# Altium footprint library 430 integreted.PcbLib: 281 footprints (part 4 of 18)
Each footprint in its own frame and in the unit in brackets; x right, y up, seen from the top. Pads: shape width x height; smd on the part's side, far side on the other; paste and mask are expansions set on the pad; w line width, h text height; cw(c..) or ccw(c..) is an arc to the next point about the centre after c.
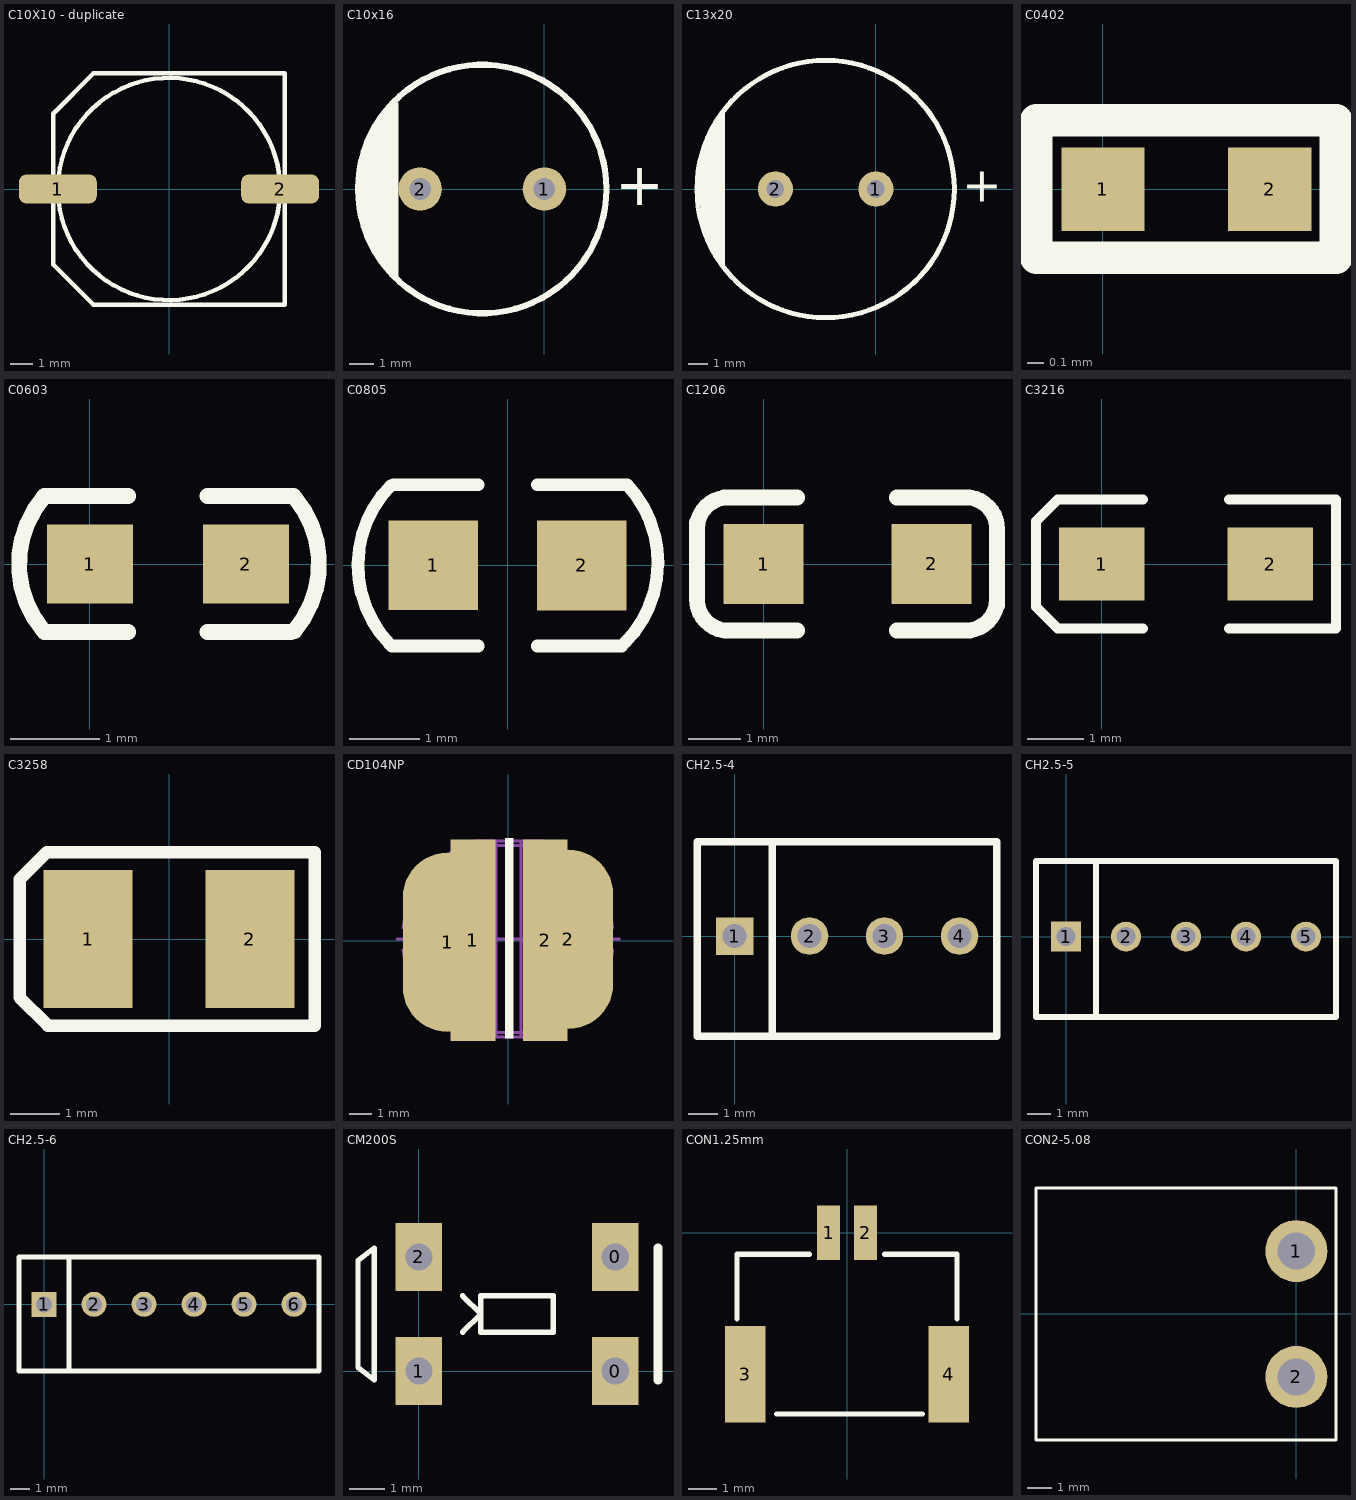
[diagram p3: the footprints below, top view; thin cyan lines are the x and y axes]

## C10X10 - duplicate [mm]
pads (2):
  rrect50% 3.5x1.3 smd: 1(-5,0) 2(5,0)
Top Overlay:
  circle w0.2: c0,0 r5
  lines w0.2: -5.2,3.404 -5.2,-3.404 -3.404,-5.2 5.2,-5.2 5.2,5.2 -3.404,5.2 -5.191,3.413
3D body: height 10.21, standoff -0.01, extent -5.775,-5.118 5.825,5.182

## C10x16 [mil]
pads (2):
  round 70 hole 35: 1(0,0) 2(-200,0)
Top Overlay:
  circle w10: c-100,0 r200
  rectangle: -250,-141 -235,139
  rectangle: -270,-111 -245,114
  rectangle: -285,-81 -260,89
  rectangle: -295,-61 -265,54
  lines w11.81: -245,129 ccw(c-105.35,1.7) -241.45,-129.39
  text "+" at 114,-26 h68.9
3D body: height 708.66, standoff -669.29, extent -296.85,-198.7 96.85,195

## C13x20 [mil]
pads (2):
  round 70 hole 35: 1(0,0) 2(-200,0)
Top Overlay:
  circle w10: c-100,0 r255.91
  rectangle: -332,-115 -314,120
  rectangle: -323,-133 -309,134
  rectangle: -312,-150 -300,151
  lines w10: -349,-30 -349,44 ; -343,-69 -343,71 ; -336,-98 -336,95
  text "+" at 172,-25 h68.9
3D body: height 786.92, standoff -748.03, extent -348.13,-246.13 144,246

## C0402 [mil]
pads (2):
  rect 20x20 smd: 1(0,0) 2(40,0)
Top Overlay:
  lines w7.87: -16.07,-16.42 55.93,-16.42 55.93,16.58 -16.07,16.58 -16.07,-16.42
3D body: height 19.68, standoff 0, extent 0.25,-9.84 39.62,9.85

## C0603 [mil]
pads (2):
  rect 38x35 smd: 1(0,0) 2(69,0)
Top Overlay:
  lines w7: -21,-29 cw(c14.45,-0.04) -20.48,29.56 ; -20,-30 17,-30 ; -20,30 17,30 ; 52,-30 89,-30 ; 52,30 90,30 ; 90.48,-29.56 ccw(c55.55,0.04) 91,29
3D body: height 11.89, standoff 0, extent 3.8,-15.8 66.8,15.7

## C0805 [mm]
pads (2):
  rect 1.27x1.27 smd: 1(-1.05,0.001) 2(1.05,-0.001)
Top Overlay:
  lines w0.178: -1.677,-1.108 cw(c-0.511,-0.001) -1.652,1.132 ; -1.64,-1.142 -0.415,-1.142 ; -1.617,1.144 -0.415,1.144 ; 0.423,-1.142 1.617,-1.142 ; 0.423,1.144 1.67,1.144 ; 1.665,-1.092 ccw(c0.524,0.04) 1.693,1.144
3D body: height 0.77, standoff -0.01, extent -1.001,-0.621 0.999,0.629

## C1206 [mil]
pads (2):
  rect 60x60 smd: 1(0,0) 2(126,0)
Top Overlay:
  lines w11.81: -50,-26 ccw(c-26.5,-26.5) -27,-50 ; -50,27 cw(c-26.5,26.5) -26,50 ; 151,-50 ccw(c151.5,-26.5) 175,-27 ; 152,50 cw(c151.5,26.5) 175,26
  lines w12: -50,-27 -50,31 ; -29,-50 25,-50 ; -28,50 25,50 ; 100,-50 153,-50 ; 100,50 154,50 ; 175,-31 175,27
3D body: height 39.45, standoff 0, extent 0.01,-31.49 126,31.5

## C3216 [mil]
pads (2):
  rect 60x51.18 smd: 1(0,0) 2(118,0)
Top Overlay:
  lines w7: 29,-45 -31,-45 -46,-30 -46,30 -31,45 29,45 ; 89,-45 164,-45 164,45 89,45
3D body: height 62.99, standoff 0, extent -4,-31 121.99,32

## C3258 [mil]
pads (2):
  rect 70.87x110 smd: 1(-64.5,0) 2(64.5,0)
Top Overlay:
  lines w10: -119,-46.5 -96.5,-69 116,-69 116,69 -97.5,69 -119,47.5 -119,-46.5
3D body: height 74.8, standoff 0, extent -68.9,-55.11 68.9,55.12

## CD104NP [mm]
pads (4):
  oval 4x8 smd mask+0: 1(-2.696,-0.067) 2(2.696,0.067)
  rect 2x9 smd mask+0: 1(-1.569,0.017) 2(1.66,0.017)
Top Overlay:
  rectangle: -0.145,-4.357 0.241,4.585
Mechanical 2:
  lines w0.127: -4.958,0.081 4.976,0.081 ; 0.029,-4.072 0.029,4.362 ; -4.689,-0.417 ccw(c0.027,0.2) -1.513,-4.3 1.568,-4.3 ccw(c0.01,0.135) 4.677,-0.417 cw(c4.709,0.082) 4.676,0.581 ccw(c0.01,0.019) 1.568,4.453 -1.513,4.453 ccw(c0.027,-0.047) -4.688,0.581 cw(c-4.721,0.082) -4.689,-0.417 ; -4.464,-0.569 ccw(c-4.721,0.082) -4.462,0.732 cw(c0.027,-0.047) -1.48,4.253 1.533,4.253 cw(c0.01,0.019) 4.453,0.733 ccw(c4.709,0.082) 4.454,-0.57 cw(c0.01,0.135) 1.533,-4.1 -1.48,-4.1 cw(c0.027,0.2) -4.464,-0.569 ; -0.525,-4.3 0.582,-4.3 0.582,4.453 -0.525,4.453 -0.525,-4.3
Mechanical 5:
  text "C10 H4.0 W9 L10" at -2.808,-5.115 h0.4
3D body: height 4, standoff -0.05, extent -4.626,-4.298 4.74,4.454

## CH2.5-4 [mil]
pads (4):
  rect 50x50 hole 32: 1(0,0)
  round 50 hole 32: 2(100,0) 3(200,0) 4(300,0)
Top Overlay:
  lines w10: 50,-133.86 50,125.98 ; -50,-133.86 350,-133.86 350,125.98 -50,125.98 -50,-133.86

## CH2.5-5 [mil]
pads (5):
  rect 50x50 hole 32: 1(0,0)
  round 50 hole 32: 2(100,0) 3(200,0) 4(300,0) 5(400,0)
Top Overlay:
  lines w10: 50,-133.86 50,125.98 ; -50,-133.86 450,-133.86 450,125.98 -50,125.98 -50,-133.86

## CH2.5-6 [mil]
pads (6):
  rect 50x50 hole 32: 1(0,0)
  round 50 hole 32: 2(100,0) 3(200,0) 4(300,0) 5(400,0) 6(500,0)
Top Overlay:
  lines w10: 50,-133.86 50,95 ; -50,-133.86 -50,95 550,95 550,-133.86 -50,-133.86

## CM200S [mm]
pads (4):
  rect 1.3x1.9 hole 0.762: 0(5.5,0) 0(5.5,3.2) 1(0,0) 2(0,3.2)
Top Overlay:
  lines w0.152: 1.226,1.092 1.734,1.6 1.226,2.108 ; -1.708,0.1 -1.708,3.1 -1.258,3.45 -1.258,-0.25 -1.708,0.1 ; 1.734,1.092 1.734,2.108 3.766,2.108 3.766,1.092 1.734,1.092
  lines w0.254: 6.7,-0.25 6.7,3.45

## CON1.25mm [mm]
pads (4):
  rect 0.8x1.9 smd: 1(-0.635,0) 2(0.635,0)
  rect 1.4x3.35 smd: 3(-3.535,-4.925) 4(3.535,-4.925)
Top Overlay:
  lines w0.178: -3.825,-2.997 -3.825,-0.75 -1.3,-0.75 ; -2.438,-6.299 2.616,-6.299 ; 1.3,-0.75 3.825,-0.75 3.825,-2.997
3D body: height 1.9, standoff 0, extent -3.8,-7.874 3.8,-0.874

## CON2-5.08 [mm]
pads (2):
  round 2.5 hole 1.5: 1(0,2.54) 2(0,-2.54)
Top Overlay:
  lines w0.127: -10.5,-5.08 -10.5,5.08 1.6,5.08 1.6,-5.08 -10.5,-5.08
3D body: height 8.6, standoff -3.5, extent -10.014,-5.08 1.988,5.08